# Altium footprint library NX Module baseboard.PcbLib: 96 footprints (part 2 of 6)
Each footprint in its own frame and in the unit in brackets; x right, y up, seen from the top. Pads: shape width x height; smd on the part's side, far side on the other; paste and mask are expansions set on the pad; w line width, h text height; cw(c..) or ccw(c..) is an arc to the next point about the centre after c.
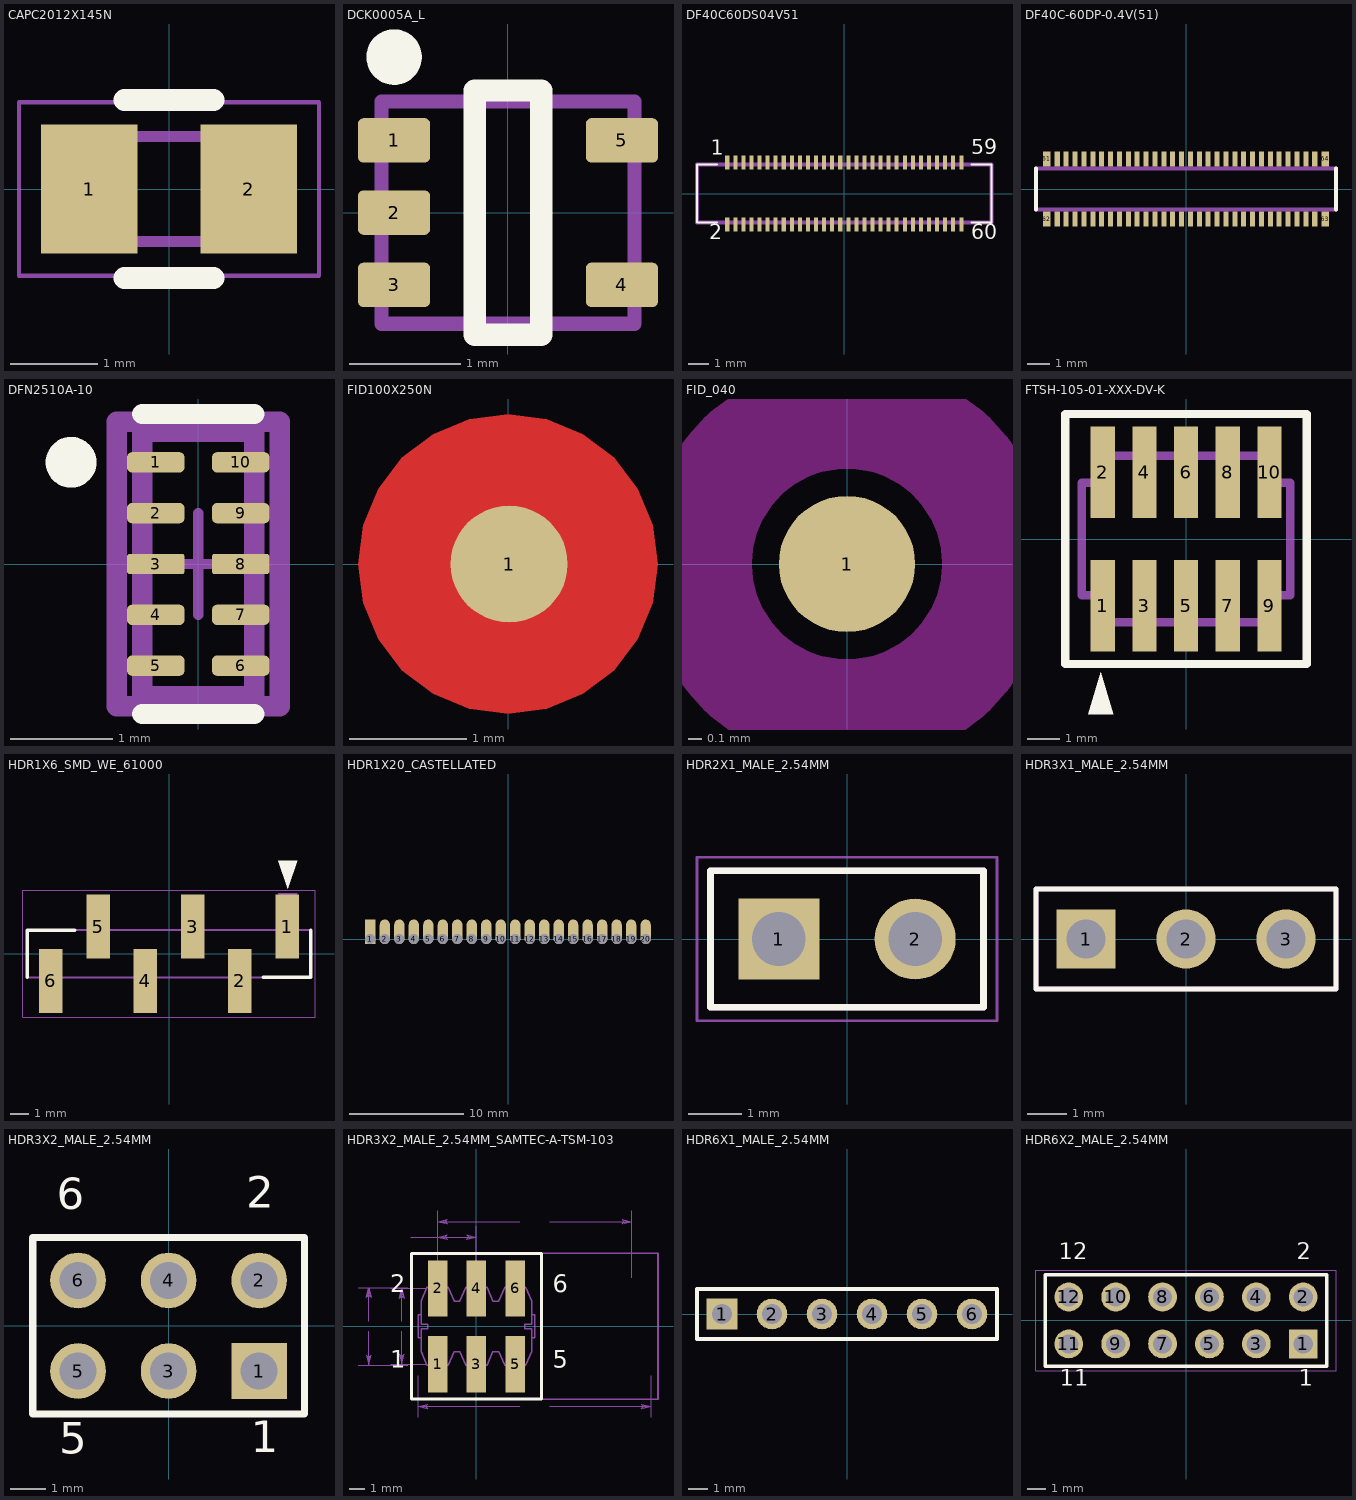
[diagram p1: the footprints below, top view; thin cyan lines are the x and y axes]

## CAPC2012X145N [mm]
pads (2):
  rect 1.1x1.48 smd mask+0.051: 1(-0.913,0) 2(0.913,0)
Top Overlay:
  lines w0.254: -0.508,-1.016 0.508,-1.016 ; -0.508,1.016 0.508,1.016
Mechanical 13:
  lines w0.127: -1,-0.6 1,-0.6 1,0.6 -1,0.6 -1,-0.6
  text ".Designator" at -0.762,-0.397 h1.27
Mechanical 15:
  lines w0.05: -1.715,-0.99 1.715,-0.99 1.715,0.99 -1.715,0.99 -1.715,-0.99
3D body "JMK212BBJ476MG-T.STEP": height 1.45, standoff 0, extent -1,-0.625 1,0.625

## DCK0005A_L [mm] "SOT23, 5-Leads, Body 2.15x1.4mm, Pitch 0.65mm, IPC High Density"
height 1.1
pads (5):
  rrect25% 0.65x0.4 smd mask+0.051: 1(-1.025,0.65) 2(-1.025,0) 3(-1.025,-0.65) 4(1.025,-0.65) 5(1.025,0.65)
Top Overlay:
  circle w0.25: c-1.025,1.4 r0.125
  lines w0.2: -0.3,-1.1 0.3,-1.1 0.3,1.1 -0.3,1.1 -0.3,-1.1
Mechanical 1:
  text ".Designator" at -0.635,-0.127 h0.3
Mechanical 13:
  lines w0.127: -1.14,-1 1.14,-1 1.14,1 -1.14,1 -1.14,-1
3D body "DCK0005AakaMAA05A.stp": height 0.94, standoff -0.01, extent -1.14,-1 1.14,1

## DF40C60DS04V51 [mm]
pads (60):
  rect 0.2x0.7 smd mask+0.051: 1(-5.8,1.54) 2(-5.8,-1.54) 3(-5.4,1.54) 4(-5.4,-1.54) 5(-5,1.54) 6(-5,-1.54) 7(-4.6,1.54) 8(-4.6,-1.54) 9(-4.2,1.54) 10(-4.2,-1.54) 11(-3.8,1.54) 12(-3.8,-1.54) 13(-3.4,1.54) 14(-3.4,-1.54) 15(-3,1.54) 16(-3,-1.54) 17(-2.6,1.54) 18(-2.6,-1.54) 19(-2.2,1.54) 20(-2.2,-1.54) 21(-1.8,1.54) 22(-1.8,-1.54) 23(-1.4,1.54) 24(-1.4,-1.54) 25(-1,1.54) 26(-1,-1.54) 27(-0.6,1.54) 28(-0.6,-1.54) 29(-0.2,1.54) 30(-0.2,-1.54) 31(0.2,1.54) 32(0.2,-1.54) 33(0.6,1.54) 34(0.6,-1.54) 35(1,1.54) 36(1,-1.54) 37(1.4,1.54) 38(1.4,-1.54) 39(1.8,1.54) 40(1.8,-1.54) 41(2.2,1.54) 42(2.2,-1.54) 43(2.6,1.54) 44(2.6,-1.54) 45(3,1.54) 46(3,-1.54) 47(3.4,1.54) 48(3.4,-1.54) 49(3.8,1.54) 50(3.8,-1.54) 51(4.2,1.54) 52(4.2,-1.54) 53(4.6,1.54) 54(4.6,-1.54) 55(5,1.54) 56(5,-1.54) 57(5.4,1.54) 58(5.4,-1.54) 59(5.8,1.54) 60(5.8,-1.54)
Top Overlay:
  lines w0.1: -6.3,-1.44 -7.3,-1.44 -7.3,1.44 -6.3,1.44 ; 6.3,-1.44 7.3,-1.44 7.3,1.44 6.3,1.44
  text "1" at -6.624,1.69 h1.27
  text "2" at -6.691,-2.518 h1.27
  text "60" at 6.3,-2.513 h1.27
  text "59" at 6.3,1.704 h1.27
Mechanical 13:
  lines w0.2: -7.3,-1.44 -7.3,1.44 7.3,1.44 7.3,-1.44 -7.3,-1.44
  text ".Designator" at -0.217,-0.078 h0.3
  text "59" at 5.8,0.339 h1.27
  text "60" at 5.8,-1.15 h1.27
  text "2" at -6.88,-1.082 h1.27
  text "1" at -6.823,0.413 h1.27
3D body "DF40C(2.0)-60DS.stp": height 1.96, standoff 0.01, extent -7.3,-1.69 7.3,1.69

## DF40C-60DP-0.4V(51) [mm]
pads (64):
  rect 0.23x0.66 smd: 1(-5.8,-1.355) 2(-5.8,1.355) 3(-5.4,-1.355) 4(-5.4,1.355) 5(-5,-1.355) 6(-5,1.355) 7(-4.6,-1.355) 8(-4.6,1.355) 9(-4.2,-1.355) 10(-4.2,1.355) 11(-3.8,-1.355) 12(-3.8,1.355) 13(-3.4,-1.355) 14(-3.4,1.355) 15(-3,-1.355) 16(-3,1.355) 17(-2.6,-1.355) 18(-2.6,1.355) 19(-2.2,-1.355) 20(-2.2,1.355) 21(-1.8,-1.355) 22(-1.8,1.355) 23(-1.4,-1.355) 24(-1.4,1.355) 25(-1,-1.355) 26(-1,1.355) 27(-0.6,-1.355) 28(-0.6,1.355) 29(-0.2,-1.355) 30(-0.2,1.355) 31(0.2,-1.355) 32(0.2,1.355) 33(0.6,-1.355) 34(0.6,1.355) 35(1,-1.355) 36(1,1.355) 37(1.4,-1.355) 38(1.4,1.355) 39(1.8,-1.355) 40(1.8,1.355) 41(2.2,-1.355) 42(2.2,1.355) 43(2.6,-1.355) 44(2.6,1.355) 45(3,-1.355) 46(3,1.355) 47(3.4,-1.355) 48(3.4,1.355) 49(3.8,-1.355) 50(3.8,1.355) 51(4.2,-1.355) 52(4.2,1.355) 53(4.6,-1.355) 54(4.6,1.355) 55(5,-1.355) 56(5,1.355) 57(5.4,-1.355) 58(5.4,1.355) 59(5.8,-1.355) 60(5.8,1.355)
  rect 0.35x0.66 smd: 61(-6.275,1.355) 62(-6.275,-1.355) 63(6.275,-1.355) 64(6.275,1.355)
Top Overlay:
  lines w0.2: -6.76,-0.925 -6.76,0.925 ; 6.76,-0.925 6.76,0.925
Mechanical 13:
  lines w0.2: -6.76,-0.925 6.76,-0.925 6.76,0.925 -6.76,0.925 -6.76,-0.925
3D body "DF40C-60DP-0.4V_51_.stp": height 1.12, standoff -0.02, extent -6.77,-1.52 6.75,1.45

## DFN2510A-10 [mm]
pads (10):
  rrect50% 0.565x0.2 smd mask+0.05: 1(-0.417,1) 2(-0.417,0.5) 4(-0.417,-0.5) 5(-0.417,-1) 6(0.417,-1) 7(0.417,-0.5) 9(0.417,0.5) 10(0.417,1)
  rrect25% 0.565x0.2 smd mask+0.05: 3(-0.417,0) 8(0.417,0)
Top Overlay:
  circle w0.25: c-1.25,1 r0.125
  lines w0.2: -0.55,-1.475 0.55,-1.475 ; -0.55,1.475 0.55,1.475
Mechanical 13:
  lines w0.2: -0.55,-1.3 0.55,-1.3 0.55,1.3 -0.55,1.3 -0.55,-1.3
  text ".Designator" at 0,0.188 h1
Mechanical 15:
  lines w0.1: -0.5,0 0.5,0 ; 0,-0.5 0,0.5
  lines w0.2: -0.8,-1.4 -0.8,1.4 ; -0.8,-1.4 0.8,-1.4 ; -0.8,-1.4 0.8,-1.4 ; -0.8,-1.4 -0.8,1.4 ; -0.8,1.4 0.8,1.4 ; -0.8,1.4 0.8,1.4 ; 0.8,-1.4 0.8,1.4 ; 0.8,-1.4 0.8,1.4
3D body "Diode_Texas_Instruments_ESD204DQAR_eec.STEP": height 0.55, standoff 0, extent -0.501,-1.25 0.501,1.25

## FID100X250N [mm]
pads (1):
  round 1 smd paste-0.5 mask+0.75: 1(0.01,0)
Top Layer:
  pour cut-out: 1.281,0 1.237,0.332 1.109,0.64 0.906,0.906 0.64,1.109 0.332,1.237 0,1.281 -0.332,1.237 -0.64,1.109 -0.906,0.906 -1.109,0.64 -1.237,0.332 -1.281,0 -1.237,-0.332 -1.109,-0.64 -0.906,-0.906 -0.64,-1.109 -0.332,-1.237 0,-1.281 0.332,-1.237 0.64,-1.109 0.906,-0.906 1.109,-0.64 1.237,-0.332

## FID_040 [mm]
height 1.3
pads (1):
  round 1 smd paste-1.5 mask+1: 1(0,0)
Top Layer keep-out:
  circle w0.8: c0,0 r1.1

## FTSH-105-01-XXX-DV-K [mil]
pads (10):
  rect 29x110 smd mask+2: 1(-100,-80) 2(-100,80) 3(-50,-80) 4(-50,80) 5(0,-80) 6(0,80) 7(50,-80) 8(50,80) 9(100,-80) 10(100,80)
Top Overlay:
  region: -102.5,-160 -117.5,-210 -87.5,-210
  lines w10: -145,-150 -145,150 145,150 145,-150 -145,-150
Mechanical 13:
  lines w10: -125,-67.5 -125,67.5 -100,67.5 -100,100 100,100 100,67.5 125,67.5 125,-67.5 100,-67.5 100,-100 -100,-100 -100,-67.5 -125,-67.5
  text ".Designator" at 15.42,-11.33 h40
3D body "FTSH-105-01-L-DV-K-TR.stp": height 241, standoff 0, extent -125,-115 125,115

## HDR1X6_SMD_WE_61000 [mm]
pads (6):
  rect 1.27x3.43 smd: 1(6.35,1.46) 2(3.81,-1.46) 3(1.27,1.46) 4(-1.27,-1.46) 5(-3.81,1.46) 6(-6.35,-1.46)
Top Overlay:
  region: 6.384,3.485 5.876,5.009 6.892,5.009
  lines w0.2: -7.62,-1.27 -7.62,1.27 -5.08,1.27 ; 5.08,-1.27 7.62,-1.27 7.62,1.27
Top Courtyard:
  lines w0.05: -7.87,-3.425 -7.87,3.425 7.87,3.425 7.87,-3.425 -7.87,-3.425
Mechanical 13:
  region: 6.384,1.738 5.876,3.262 6.892,3.262
  lines w0.1: -7.62,-1.27 7.62,-1.27 7.62,1.27 -7.62,1.27 -7.62,-1.27
  text ".Designator" at -1.046,-0.367 h1.52
3D body "61000618221_Download_STP_61000618221_rev1.stp": height 9.43, standoff 0.1, extent -7.62,-2.5 7.62,2.5

## HDR1X20_CASTELLATED [mil]
pads (20):
  rect 35x85 hole 35 copper offset 0,25 mask+2: 1(-475,0)
  oval 35x85 hole 35 copper offset 0,25 mask+2: 2(-425,0) 3(-375,0) 4(-325,0) 5(-275,0) 6(-225,0) 7(-175,0) 8(-125,0) 9(-75,0) 10(-25,0) 11(25,0) 12(75,0) 13(125,0) 14(175,0) 15(225,0) 16(275,0) 17(325,0) 18(375,0) 19(425,0) 20(475,0)
Mechanical 13:
  text ".Designator" at -125,0 h40

## HDR2X1_MALE_2.54MM [mm]
pads (2):
  rect 1.508x1.508 hole 1: 1(-1.27,0)
  round 1.508 hole 1: 2(1.27,0)
Top Overlay:
  lines w0.127: -2.54,-1.27 2.54,-1.27 2.54,1.27 -2.54,1.27 -2.54,-1.27
Top Courtyard:
  lines w0.05: -2.794,-1.524 2.794,-1.524 2.794,1.524 -2.794,1.524 -2.794,-1.524
Mechanical 13:
  lines w0.127: -2.54,-1.27 -2.54,1.27 2.54,1.27 2.54,-1.27 -2.54,-1.27
  text ".Designator" at -0.452,-0.436 h1.52
3D body "PRPC002SAAN-RC.stp": height 8.38, standoff -3.05, extent -2.54,-1.375 2.54,1.165

## HDR3X1_MALE_2.54MM [mm]
pads (3):
  rect 1.508x1.508 hole 1: 1(-2.54,0)
  round 1.508 hole 1: 2(0,0) 3(2.54,0)
Top Overlay:
  lines w0.127: -3.81,-1.27 3.81,-1.27 3.81,1.27 -3.81,1.27 -3.81,-1.27
Mechanical 13:
  lines w0.127: -3.81,-1.27 3.81,-1.27 3.81,1.27 -3.81,1.27 -3.81,-1.27
  text ".Designator" at -1.27,-0.635 h1.52
3D body "PRPC003SAAN-RC.STEP": height 7.62, standoff -3.05, extent -3.81,-1.27 3.81,1.27

## HDR3X2_MALE_2.54MM [mm]
pads (6):
  rect 1.56x1.56 hole 1.04: 1(2.54,-1.27)
  round 1.56 hole 1.04: 2(2.54,1.27) 3(0,-1.27) 4(0,1.27) 5(-2.54,-1.27) 6(-2.54,1.27)
Top Overlay:
  lines w0.2: -3.81,-2.475 -3.81,2.475 3.81,2.475 3.81,-2.475 -3.81,-2.475
  text "1" at 2.308,-3.838 h1.52
  text "2" at 2.184,3.012 h1.52
  text "5" at -3.071,-3.878 h1.52
  text "6" at -3.132,2.972 h1.52
Mechanical 13:
  lines w0.1: -3.81,-2.515 -3.81,2.515 3.81,2.515 3.81,-2.515 -3.81,-2.515
  text ".Designator" at -0.85,-0.306 h1.27
  text "1" at 2.317,-2.198 h1.52
  text "2" at 2.211,1.213 h1.52
  text "5" at -2.928,-2.221 h1.52
  text "6" at -2.953,1.223 h1.52
3D body "67997-206HLF.STEP": height 8.38, standoff -3.05, extent -3.81,-2.415 3.81,2.415

## HDR3X2_MALE_2.54MM_SAMTEC-A-TSM-103 [mm]
pads (6):
  rect 1.27x3.68 smd: 1(-2.54,-2.476) 2(-2.54,2.476) 3(0,-2.476) 4(0,2.476) 5(2.54,-2.476) 6(2.54,2.476)
Top Overlay:
  lines w0.2: -4.26,-4.768 -4.26,4.768 4.26,4.768 4.26,-4.768 -4.26,-4.768
  text "1" at -5.63,-3.112 h1.97
  text "2" at -5.63,1.842 h1.97
  text "5" at 4.999,-3.118 h1.97
  text "6" at 4.999,1.836 h1.97
Top Paste:
  rectangle: -3.175,-4.316 -1.905,-0.636
  rectangle: -3.175,0.636 -1.905,4.316
  rectangle: -0.635,-4.316 0.635,-0.636
  rectangle: -0.635,0.636 0.635,4.316
  rectangle: 1.905,-4.316 3.175,-0.636
  rectangle: 1.905,0.636 3.175,4.316
Top Solder:
  rectangle: -3.226,-4.367 -1.854,-0.585
  rectangle: -3.226,0.585 -1.854,4.367
  rectangle: -0.686,-4.367 0.686,-0.585
  rectangle: -0.686,0.585 0.686,4.367
  rectangle: 1.854,-4.367 3.226,-0.585
  rectangle: 1.854,0.585 3.226,4.367
Mechanical 13:
  lines w0.1: -3.62,-0.762 -3.81,-0.762 -3.81,0.762 -3.62,0.762 ; -2.858,-2.54 -2.858,-3.721 -2.222,-3.721 -2.222,-2.54 ; -2.858,2.54 -2.858,3.721 -2.222,3.721 -2.222,2.54 ; -0.318,-2.54 -0.318,-3.721 0.318,-3.721 0.318,-2.54 ; -0.318,2.54 -0.318,3.721 0.318,3.721 0.318,2.54 ; 2.222,-2.54 2.222,-3.721 2.858,-3.721 2.858,-2.54 ; 2.222,2.54 2.222,3.721 2.858,3.721 2.858,2.54 ; 3.62,-0.762 3.62,-0.146 3.175,-0.146 3.175,0.146 3.62,0.146 3.62,0.762 ; 3.62,-0.762 3.81,-0.762 3.81,0.762 3.62,0.762 ; 3.62,-0.762 3.62,-1.651 3.238,-2.54 1.842,-2.54 1.46,-1.651 1.08,-1.651 0.698,-2.54 -0.698,-2.54 -1.08,-1.651 -1.46,-1.651 -1.842,-2.54 -3.238,-2.54 -3.62,-1.651 -3.62,-0.146 -3.175,-0.146 -3.175,0.146 -3.62,0.146 -3.62,1.651 -3.238,2.54 -1.842,2.54 -1.46,1.651 -1.08,1.651 -0.698,2.54 0.698,2.54 1.08,1.651 1.46,1.651 1.842,2.54 3.238,2.54 3.62,1.651 3.62,0.762
  text ".Designator" at -1.08,-0.352 h1.27
  text "6" at 4.999,1.836 h1.97
  text "5" at 4.999,-3.118 h1.97
  text "2" at -5.63,1.842 h1.97
  text "1" at -5.63,-3.112 h1.97
Mechanical 40:
  lines w0: -7.75,-2.54 -4.511,-2.54 ; -7.75,2.54 -4.511,2.54 ; -7.048,-0.318 -7.048,-2.54 ; -7.048,0.318 -7.048,2.54 ; -5.591,-2.476 -3.241,-2.476 ; -5.591,2.476 -3.241,2.476 ; -4.89,-0.318 -4.89,-2.476 ; -4.89,0.318 -4.89,2.476 ; -4.293,5.842 -2.54,5.842 ; -3.81,-5.946 -3.81,-3.241 ; -2.54,6.543 -2.54,3.178 -2.54,7.559 ; 0,3.178 0,6.543 ; 2.819,-5.245 -3.81,-5.245 ; 2.819,6.858 -2.54,6.858 ; 4.801,-5.245 11.43,-5.245 ; 4.801,6.858 10.16,6.858 ; 10.16,3.178 10.16,7.559 ; 11.43,-5.946 11.43,-3.241 ; -7.207,-1.905 -7.048,-2.54 ; -7.207,-1.905 -7.048,-2.032 ; -7.207,-1.905 -7.128,-1.968 -7.048,-2.54 ; -7.048,-2.54 -6.89,-1.905 -7.048,-2.032 ; -7.048,-2.54 -6.969,-1.968 -7.048,-2.032 ; -7.048,-2.54 -7.048,-2.032 ; -7.048,2.032 -7.207,1.905 -7.048,2.54 ; -7.048,2.032 -6.89,1.905 ; -7.048,2.032 -7.128,1.968 -7.048,2.54 ; -7.048,2.032 -7.048,2.54 ; -7.048,2.54 -6.89,1.905 ; -7.048,2.54 -6.969,1.968 -6.89,1.905 ; -5.048,-1.842 -4.89,-2.476 ; -5.048,-1.842 -4.89,-1.968 ; -5.048,-1.842 -4.969,-1.905 -4.89,-2.476 ; -4.89,-2.476 -4.731,-1.842 -4.89,-1.968 ; -4.89,-2.476 -4.81,-1.905 -4.89,-1.968 ; -4.89,-2.476 -4.89,-1.968 ; -4.89,1.968 -5.048,1.842 -4.89,2.476 ; -4.89,1.968 -4.731,1.842 ; -4.89,1.968 -4.969,1.905 -4.89,2.476 ; -4.89,1.968 -4.89,2.476 ; -4.89,2.476 -4.731,1.842 ; -4.89,2.476 -4.81,1.905 -4.731,1.842 ; -3.81,-5.245 -3.175,-5.086 ; -3.81,-5.245 -3.175,-5.404 -3.302,-5.245 ; -3.81,-5.245 -3.238,-5.324 -3.302,-5.245 ; -3.81,-5.245 -3.302,-5.245 ; -3.81,-5.245 -3.238,-5.166 -3.175,-5.086 ; -3.302,-5.245 -3.175,-5.086 ; -2.54,5.842 -1.905,6.001 ; -2.54,5.842 -1.905,5.683 -2.032,5.842 ; -2.54,5.842 -1.968,5.763 -2.032,5.842 ; -2.54,5.842 -2.032,5.842 ; -2.54,5.842 -1.968,5.921 -1.905,6.001 ; -2.54,5.842 0,5.842 ; -2.54,6.858 -1.905,7.017 ; -2.54,6.858 -1.905,6.699 -2.032,6.858 ; -2.54,6.858 -1.968,6.779 -2.032,6.858 ; -2.54,6.858 -2.032,6.858 ; -2.54,6.858 -1.968,6.937 -1.905,7.017 ; -2.032,5.842 -1.905,6.001 ; -2.032,6.858 -1.905,7.017 ; -0.635,5.683 0,5.842 ; -0.635,5.683 -0.508,5.842 ; -0.635,5.683 -0.572,5.763 0,5.842 ; -0.508,5.842 -0.635,6.001 0,5.842 ; -0.508,5.842 -0.572,5.921 0,5.842 ; -0.508,5.842 0,5.842 ; 9.525,6.699 10.16,6.858 ; 9.525,6.699 9.652,6.858 ; 9.525,6.699 9.588,6.779 10.16,6.858 ; 9.652,6.858 9.525,7.017 10.16,6.858 ; 9.652,6.858 9.588,6.937 10.16,6.858 ; 9.652,6.858 10.16,6.858 ; 10.795,-5.404 11.43,-5.245 ; 10.795,-5.404 10.922,-5.245 ; 10.795,-5.404 10.858,-5.324 11.43,-5.245 ; 10.922,-5.245 10.795,-5.086 11.43,-5.245 ; 10.922,-5.245 10.858,-5.166 11.43,-5.245 ; 10.922,-5.245 11.43,-5.245
  text "4.953" at -5.55,-0.127 h0.39
  text "5.080" at -7.709,-0.127 h0.39
  text "2.540" at -5.804,5.715 h0.39
  text "15.240" at 3.01,-5.372 h0.39
  text "12.700" at 3.01,6.731 h0.39
Mechanical 42:
  lines w0.1: -4.26,-4.768 -4.26,4.768 11.88,4.768 11.88,-4.768 -4.26,-4.768
3D body "step_temp.STEP": height 9.91, standoff 0, extent -3.81,-3.848 3.81,3.848

## HDR6X1_MALE_2.54MM [mm]
pads (6):
  rect 1.56x1.56 hole 1.04: 1(-6.35,0)
  round 1.56 hole 1.04: 2(-3.81,0) 3(-1.27,0) 4(1.27,0) 5(3.81,0) 6(6.35,0)
Top Overlay:
  lines w0.2: -7.62,-1.27 7.62,-1.27 7.62,1.27 -7.62,1.27 -7.62,-1.27
Mechanical 13:
  lines w0.1: -7.62,-1.27 7.62,-1.27 7.62,1.27 -7.62,1.27 -7.62,-1.27
  text ".Designator" at -1.906,-0.309 h1.27
3D body "68000-x06.stp": height 8.43, standoff -2.36, extent -7.62,-1.206 7.62,1.206

## HDR6X2_MALE_2.54MM [mm]
pads (12):
  rect 1.56x1.56 hole 1.04: 1(6.35,-1.27)
  round 1.56 hole 1.04: 2(6.35,1.27) 3(3.81,-1.27) 4(3.81,1.27) 5(1.27,-1.27) 6(1.27,1.27) 7(-1.27,-1.27) 8(-1.27,1.27) 9(-3.81,-1.27) 10(-3.81,1.27) 11(-6.35,-1.27) 12(-6.35,1.27)
Top Overlay:
  lines w0.2: -7.62,-2.475 -7.62,2.475 7.62,2.475 7.62,-2.475 -7.62,-2.475
  text "1" at 6.118,-3.838 h1.52
  text "2" at 5.994,3.012 h1.52
  text "11" at -6.83,-3.838 h1.52
  text "12" at -6.891,3.012 h1.52
Top Courtyard:
  lines w0.05: -8.125,-2.725 -8.125,2.725 8.125,2.725 8.125,-2.725 -8.125,-2.725
Mechanical 13:
  lines w0.1: -7.62,-2.515 -7.62,2.515 7.62,2.515 7.62,-2.515 -7.62,-2.515
  text ".Designator" at -2.492,-0.377 h1.27
  text "1" at 6.127,-2.198 h1.52
  text "2" at 6.021,1.213 h1.52
  text "11" at -7.088,-2.224 h1.52
  text "12" at -7.113,1.221 h1.52
3D body "67997-212HLF--3DModel-STEP-554624.STEP": height 8.38, standoff -3.05, extent -7.62,-2.415 7.62,2.415